# Altium footprint library PcbLib_ICs_part2.PcbLib: 66 footprints (part 2 of 5) (continued)
## DFN-10_ONSEMI [mm] "DFN-10 package with 0.5mm pitch"
height 1
pads (11):
  rect 0.3x0.7 smd paste+0 mask+0.05: 1(-1,-1.5)
  oval 0.3x0.7 smd paste+0 mask+0.05: 2(-0.5,-1.5) 3(0,-1.5) 4(0.5,-1.5) 5(1,-1.5) 6(1,1.5) 7(0.5,1.5) 8(0,1.5) 9(-0.5,1.5) 10(-1,1.5)
  rrect10% 2.64x1.9 smd paste-10 mask+0.05: EP(0,0)
via 0,0 diameter 0.7 hole 0.3
via -0.8,-0.4 diameter 0.7 hole 0.3
via -0.8,0.4 diameter 0.7 hole 0.3
via 0.8,0.4 diameter 0.7 hole 0.3
via 0.8,-0.4 diameter 0.7 hole 0.3
Top Overlay:
  circle w0.25: c-1.55,-2.35 r0.125
  lines w0.2: -1.525,-1.7 -1.7,-1.7 -1.7,1.7 -1.525,1.7 ; 1.525,-1.7 1.7,-1.7 1.7,1.7 1.525,1.7
Top Paste:
  region: 0.5,0.7 0.5,0.1 1.1,0.1 1.1,0.7
  region: 0.5,-0.1 0.5,-0.7 1.1,-0.7 1.1,-0.1
  region: -0.5,-0.7 -0.5,-0.1 -1.1,-0.1 -1.1,-0.7
  region: -0.5,0.1 -0.5,0.7 -1.1,0.7 -1.1,0.1
  region: 0.3,-0.7 0.3,-0.1 -0.3,-0.1 -0.3,-0.7
  region: 0.3,0.1 0.3,0.7 -0.3,0.7 -0.3,0.1
Bottom Solder:
  region: -1.6,-1 -1.6,-0.3 -1.3,0 -1.6,0.3 -1.6,1 -0.3,1 0,0.7 0.3,1 1.6,1 1.6,0.3 1.3,0 1.6,-0.3 1.6,-1 0.3,-1 0,-0.7 -0.3,-1
Top Assy:
  circle w0.05: c-1.25,-1.25 r0.15
  lines w0.05: -1.13,-1.55 -1.13,-1.675 -0.88,-1.675 -0.88,-1.55 ; -1.13,1.55 -1.13,1.675 -0.88,1.675 -0.88,1.55 ; -0.63,-1.55 -0.63,-1.675 -0.38,-1.675 -0.38,-1.55 ; -0.63,1.55 -0.63,1.675 -0.38,1.675 -0.38,1.55 ; -0.13,-1.55 -0.13,-1.675 0.12,-1.675 0.12,-1.55 ; -0.13,1.55 -0.13,1.675 0.12,1.675 0.12,1.55 ; 0.37,-1.55 0.37,-1.675 0.62,-1.675 0.62,-1.55 ; 0.37,1.55 0.37,1.675 0.62,1.675 0.62,1.55 ; 0.87,-1.55 0.87,-1.675 1.12,-1.675 1.12,-1.55 ; 0.87,1.55 0.87,1.675 1.12,1.675 1.12,1.55 ; -1.55,-1.55 -1.55,1.55 1.55,1.55 1.55,-1.55 -1.55,-1.55
  text ".Designator" at -3.443,-0.467 h2
Top Text:
  lines w0.05: -1.85,-1.85 -1.85,1.85 1.85,1.85 1.85,-1.85 -1.85,-1.85
  lines w0.1: -0.5,0 0.5,0 ; 0,-0.5 0,0.5
3D body "DFN10_ONSEMI.x_t": height 1, standoff 0, extent -1.5,-1.525 1.5,1.525

## eLQFP-128 [mm] "TSQFP, 128-Leads, Body 14.00x14.00mm, Pitch 0.40mm, IPC Medium Density"
height 1.6
pads (129):
  rect 0.2x1.3 smd paste+0 mask+0.05: 1(-6.2,-7.725)
  oval 0.2x1.3 smd paste+0 mask+0.05: 2(-5.8,-7.725) 3(-5.4,-7.725) 4(-5,-7.725) 5(-4.6,-7.725) 6(-4.2,-7.725) 7(-3.8,-7.725) 8(-3.4,-7.725) 9(-3,-7.725) 10(-2.6,-7.725) 11(-2.2,-7.725) 12(-1.8,-7.725) 13(-1.4,-7.725) 14(-1,-7.725) 15(-0.6,-7.725) 16(-0.2,-7.725) 17(0.2,-7.725) 18(0.6,-7.725) 19(1,-7.725) 20(1.4,-7.725) 21(1.8,-7.725) 22(2.2,-7.725) 23(2.6,-7.725) 24(3,-7.725) 25(3.4,-7.725) 26(3.8,-7.725) 27(4.2,-7.725) 28(4.6,-7.725) 29(5,-7.725) 30(5.4,-7.725) 31(5.8,-7.725) 32(6.2,-7.725) 65(6.2,7.725) 66(5.8,7.725) 67(5.4,7.725) 68(5,7.725) 69(4.6,7.725) 70(4.2,7.725) 71(3.8,7.725) 72(3.4,7.725) 73(3,7.725) 74(2.6,7.725) 75(2.2,7.725) 76(1.8,7.725) 77(1.4,7.725) 78(1,7.725) 79(0.6,7.725) 80(0.2,7.725) 81(-0.2,7.725) 82(-0.6,7.725) 83(-1,7.725) 84(-1.4,7.725) 85(-1.8,7.725) 86(-2.2,7.725) 87(-2.6,7.725) 88(-3,7.725) 89(-3.4,7.725) 90(-3.8,7.725) 91(-4.2,7.725) 92(-4.6,7.725) 93(-5,7.725) 94(-5.4,7.725) 95(-5.8,7.725) 96(-6.2,7.725)
  oval 1.3x0.2 smd paste+0 mask+0.05: 33(7.725,-6.2) 34(7.725,-5.8) 35(7.725,-5.4) 36(7.725,-5) 37(7.725,-4.6) 38(7.725,-4.2) 39(7.725,-3.8) 40(7.725,-3.4) 41(7.725,-3) 42(7.725,-2.6) 43(7.725,-2.2) 44(7.725,-1.8) 45(7.725,-1.4) 46(7.725,-1) 47(7.725,-0.6) 48(7.725,-0.2) 49(7.725,0.2) 50(7.725,0.6) 51(7.725,1) 52(7.725,1.4) 53(7.725,1.8) 54(7.725,2.2) 55(7.725,2.6) 56(7.725,3) 57(7.725,3.4) 58(7.725,3.8) 59(7.725,4.2) 60(7.725,4.6) 61(7.725,5) 62(7.725,5.4) 63(7.725,5.8) 64(7.725,6.2) 97(-7.725,6.2) 98(-7.725,5.8) 99(-7.725,5.4) 100(-7.725,5) 101(-7.725,4.6) 102(-7.725,4.2) 103(-7.725,3.8) 104(-7.725,3.4) 105(-7.725,3) 106(-7.725,2.6) 107(-7.725,2.2) 108(-7.725,1.8) 109(-7.725,1.4) 110(-7.725,1) 111(-7.725,0.6) 112(-7.725,0.2) 113(-7.725,-0.2) 114(-7.725,-0.6) 115(-7.725,-1) 116(-7.725,-1.4) 117(-7.725,-1.8) 118(-7.725,-2.2) 119(-7.725,-2.6) 120(-7.725,-3) 121(-7.725,-3.4) 122(-7.725,-3.8) 123(-7.725,-4.2) 124(-7.725,-4.6) 125(-7.725,-5) 126(-7.725,-5.4) 127(-7.725,-5.8) 128(-7.725,-6.2)
  rrect5% 8.2x8.2 smd paste-5 mask+0.05: EP(0,0)
Top Overlay:
  circle w0.25: c-6.9,-7.725 r0.125
  circle w0.6: c-5.6,-5.6 r0.3
  lines w0.2: -9.6,-6.2 -8.6,-6.2 ; -9.6,-3 -8.6,-3 ; -9.6,0.2 -8.6,0.2 ; -9.6,3.4 -8.6,3.4 ; -9.6,6.2 -8.6,6.2 ; -7.125,-6.525 -7.125,-7.125 -6.5,-7.125 ; -7.075,6.45 -7.075,7.075 -6.475,7.075 ; -6.2,-9.6 -6.2,-8.6 ; -6.2,8.6 -6.2,9.4 ; -3.4,-9.6 -3.4,-8.6 ; -3,8.6 -3,9.6 ; -0.2,-9.6 -0.2,-8.6 ; 0.2,8.6 0.2,9.6 ; 3,-9.6 3,-8.6 ; 3.4,8.6 3.4,9.6 ; 6.2,-9.6 6.2,-8.6 ; 6.2,8.6 6.2,9.6 ; 6.5,7.125 7.125,7.125 7.125,6.525 ; 6.525,-7.125 7.125,-7.125 7.125,-6.5 ; 8.6,-6.2 9.6,-6.2 ; 8.6,-3.4 9.6,-3.4 ; 8.6,-0.2 9.6,-0.2 ; 8.6,3 9.6,3 ; 8.6,6.2 9.6,6.2
Top Paste:
  region: 2.5,-3.3 2.5,-3.9 3.1,-3.9 3.1,-3.3
  region: 2.5,-2.5 2.5,-3.1 3.1,-3.1 3.1,-2.5
  region: 2.5,-1.7 2.5,-2.3 3.1,-2.3 3.1,-1.7
  region: 2.5,-0.9 2.5,-1.5 3.1,-1.5 3.1,-0.9
  region: 3.3,-3.3 3.3,-3.9 3.9,-3.9 3.9,-3.3
  region: 3.3,-2.5 3.3,-3.1 3.9,-3.1 3.9,-2.5
  region: 3.3,-1.7 3.3,-2.3 3.9,-2.3 3.9,-1.7
  region: 3.3,-0.9 3.3,-1.5 3.9,-1.5 3.9,-0.9
  region: 0.9,-3.3 0.9,-3.9 1.5,-3.9 1.5,-3.3
  region: 0.9,-2.5 0.9,-3.1 1.5,-3.1 1.5,-2.5
  region: 0.9,-1.7 0.9,-2.3 1.5,-2.3 1.5,-1.7
  region: 0.9,-0.9 0.9,-1.5 1.5,-1.5 1.5,-0.9
  region: 1.7,-3.3 1.7,-3.9 2.3,-3.9 2.3,-3.3
  region: 1.7,-2.5 1.7,-3.1 2.3,-3.1 2.3,-2.5
  region: 1.7,-1.7 1.7,-2.3 2.3,-2.3 2.3,-1.7
  region: 1.7,-0.9 1.7,-1.5 2.3,-1.5 2.3,-0.9
  region: -2.3,-3.3 -2.3,-3.9 -1.7,-3.9 -1.7,-3.3
  region: -2.3,-2.5 -2.3,-3.1 -1.7,-3.1 -1.7,-2.5
  region: -2.3,-1.7 -2.3,-2.3 -1.7,-2.3 -1.7,-1.7
  region: -2.3,-0.9 -2.3,-1.5 -1.7,-1.5 -1.7,-0.9
  region: -1.5,-3.3 -1.5,-3.9 -0.9,-3.9 -0.9,-3.3
  region: -1.5,-2.5 -1.5,-3.1 -0.9,-3.1 -0.9,-2.5
  region: -1.5,-1.7 -1.5,-2.3 -0.9,-2.3 -0.9,-1.7
  region: -1.5,-0.9 -1.5,-1.5 -0.9,-1.5 -0.9,-0.9
  region: -3.9,-3.3 -3.9,-3.9 -3.3,-3.9 -3.3,-3.3
  region: -3.9,-2.5 -3.9,-3.1 -3.3,-3.1 -3.3,-2.5
  region: -3.9,-1.7 -3.9,-2.3 -3.3,-2.3 -3.3,-1.7
  region: -3.9,-0.9 -3.9,-1.5 -3.3,-1.5 -3.3,-0.9
  region: -3.1,-3.3 -3.1,-3.9 -2.5,-3.9 -2.5,-3.3
  region: -3.1,-2.5 -3.1,-3.1 -2.5,-3.1 -2.5,-2.5
  region: -3.1,-1.7 -3.1,-2.3 -2.5,-2.3 -2.5,-1.7
  region: -3.1,-0.9 -3.1,-1.5 -2.5,-1.5 -2.5,-0.9
  region: -2.5,3.3 -2.5,3.9 -3.1,3.9 -3.1,3.3
  region: -2.5,2.5 -2.5,3.1 -3.1,3.1 -3.1,2.5
  region: -2.5,1.7 -2.5,2.3 -3.1,2.3 -3.1,1.7
  region: -2.5,0.9 -2.5,1.5 -3.1,1.5 -3.1,0.9
  region: -3.3,3.3 -3.3,3.9 -3.9,3.9 -3.9,3.3
  region: -3.3,2.5 -3.3,3.1 -3.9,3.1 -3.9,2.5
  region: -3.3,1.7 -3.3,2.3 -3.9,2.3 -3.9,1.7
  region: -3.3,0.9 -3.3,1.5 -3.9,1.5 -3.9,0.9
  region: -0.9,3.3 -0.9,3.9 -1.5,3.9 -1.5,3.3
  region: -0.9,2.5 -0.9,3.1 -1.5,3.1 -1.5,2.5
  region: -0.9,1.7 -0.9,2.3 -1.5,2.3 -1.5,1.7
  region: -0.9,0.9 -0.9,1.5 -1.5,1.5 -1.5,0.9
  region: -1.7,3.3 -1.7,3.9 -2.3,3.9 -2.3,3.3
  region: -1.7,2.5 -1.7,3.1 -2.3,3.1 -2.3,2.5
  region: -1.7,1.7 -1.7,2.3 -2.3,2.3 -2.3,1.7
  region: -1.7,0.9 -1.7,1.5 -2.3,1.5 -2.3,0.9
  region: 3.9,3.3 3.9,3.9 3.3,3.9 3.3,3.3
  region: 3.9,2.5 3.9,3.1 3.3,3.1 3.3,2.5
  region: 3.9,1.7 3.9,2.3 3.3,2.3 3.3,1.7
  region: 3.9,0.9 3.9,1.5 3.3,1.5 3.3,0.9
  region: 3.1,3.3 3.1,3.9 2.5,3.9 2.5,3.3
  region: 3.1,2.5 3.1,3.1 2.5,3.1 2.5,2.5
  region: 3.1,1.7 3.1,2.3 2.5,2.3 2.5,1.7
  region: 3.1,0.9 3.1,1.5 2.5,1.5 2.5,0.9
  region: 2.3,3.3 2.3,3.9 1.7,3.9 1.7,3.3
  region: 2.3,2.5 2.3,3.1 1.7,3.1 1.7,2.5
  region: 2.3,1.7 2.3,2.3 1.7,2.3 1.7,1.7
  region: 2.3,0.9 2.3,1.5 1.7,1.5 1.7,0.9
  region: 1.5,3.3 1.5,3.9 0.9,3.9 0.9,3.3
  region: 1.5,2.5 1.5,3.1 0.9,3.1 0.9,2.5
  region: 1.5,1.7 1.5,2.3 0.9,2.3 0.9,1.7
  region: 1.5,0.9 1.5,1.5 0.9,1.5 0.9,0.9
  region: 0.7,3.3 0.7,3.9 0.1,3.9 0.1,3.3
  region: 0.7,2.5 0.7,3.1 0.1,3.1 0.1,2.5
  region: 0.7,1.7 0.7,2.3 0.1,2.3 0.1,1.7
  region: 0.7,0.9 0.7,1.5 0.1,1.5 0.1,0.9
  region: -0.1,3.3 -0.1,3.9 -0.7,3.9 -0.7,3.3
  region: -0.1,2.5 -0.1,3.1 -0.7,3.1 -0.7,2.5
  region: -0.1,1.7 -0.1,2.3 -0.7,2.3 -0.7,1.7
  region: -0.1,0.9 -0.1,1.5 -0.7,1.5 -0.7,0.9
  region: -0.7,-3.3 -0.7,-3.9 -0.1,-3.9 -0.1,-3.3
  region: -0.7,-2.5 -0.7,-3.1 -0.1,-3.1 -0.1,-2.5
  region: -0.7,-1.7 -0.7,-2.3 -0.1,-2.3 -0.1,-1.7
  region: -0.7,-0.9 -0.7,-1.5 -0.1,-1.5 -0.1,-0.9
  region: 0.1,-3.3 0.1,-3.9 0.7,-3.9 0.7,-3.3
  region: 0.1,-2.5 0.1,-3.1 0.7,-3.1 0.7,-2.5
  region: 0.1,-1.7 0.1,-2.3 0.7,-2.3 0.7,-1.7
  region: 0.1,-0.9 0.1,-1.5 0.7,-1.5 0.7,-0.9
  region: -3.3,0.7 -3.9,0.7 -3.9,0.1 -3.3,0.1
  region: -2.5,0.7 -3.1,0.7 -3.1,0.1 -2.5,0.1
  region: -1.7,0.7 -2.3,0.7 -2.3,0.1 -1.7,0.1
  region: -0.9,0.7 -1.5,0.7 -1.5,0.1 -0.9,0.1
  region: -3.3,-0.1 -3.9,-0.1 -3.9,-0.7 -3.3,-0.7
  region: -2.5,-0.1 -3.1,-0.1 -3.1,-0.7 -2.5,-0.7
  region: -1.7,-0.1 -2.3,-0.1 -2.3,-0.7 -1.7,-0.7
  region: -0.9,-0.1 -1.5,-0.1 -1.5,-0.7 -0.9,-0.7
  rectangle: 3.3,0.1 3.9,0.7
  rectangle: 2.5,0.1 3.1,0.7
  rectangle: 1.7,0.1 2.3,0.7
  rectangle: 0.9,0.1 1.5,0.7
  rectangle: 3.3,-0.7 3.9,-0.1
  rectangle: 2.5,-0.7 3.1,-0.1
  rectangle: 1.7,-0.7 2.3,-0.1
  rectangle: 0.9,-0.7 1.5,-0.1
  rectangle: -0.7,-0.7 -0.1,-0.1
  rectangle: 0.1,-0.7 0.7,-0.1
  rectangle: 0.1,0.1 0.7,0.7
  rectangle: -0.7,0.1 -0.1,0.7
Top Assy:
  drawing of 2431 lines, arcs and shapes, not listed
  text ".Designator" at -3.443,-0.467 h2
Top Text:
  lines w0.05: -8.7,-8.7 -8.7,8.7 8.7,8.7 8.7,-8.7 -8.7,-8.7
  lines w0.1: -0.5,0 0.5,0 ; 0,-0.5 0,0.5
3D body "eLQFP-128.STEP": height 1.44, standoff -0.04, extent -8,-8 8,8

## FBGA200_LPDDR4 [mm] "BGA, 200-Leads, Body 10,00x15,00mmx0,90mm, Pitch 0,65mm"
height 0.9
pads (200):
  round 0.27 smd mask+0.05: A1(-4.4,6.825) A2(-3.6,6.825) A3(-2.8,6.825) A4(-2,6.825) A5(-1.2,6.825) A8(1.2,6.825) A9(2,6.825) A10(2.8,6.825) A11(3.6,6.825) A12(4.4,6.825) AA1(-4.4,-6.175) AA2(-3.6,-6.175) AA3(-2.8,-6.175) AA4(-2,-6.175) AA5(-1.2,-6.175) AA8(1.2,-6.175) AA9(2,-6.175) AA10(2.8,-6.175) AA11(3.6,-6.175) AA12(4.4,-6.175) AB1(-4.4,-6.825) AB2(-3.6,-6.825) AB3(-2.8,-6.825) AB4(-2,-6.825) AB5(-1.2,-6.825) AB8(1.2,-6.825) AB9(2,-6.825) AB10(2.8,-6.825) AB11(3.6,-6.825) AB12(4.4,-6.825) B1(-4.4,6.175) B2(-3.6,6.175) B3(-2.8,6.175) B4(-2,6.175) B5(-1.2,6.175) B8(1.2,6.175) B9(2,6.175) B10(2.8,6.175) B11(3.6,6.175) B12(4.4,6.175) C1(-4.4,5.525) C2(-3.6,5.525) C3(-2.8,5.525) C4(-2,5.525) C5(-1.2,5.525) C8(1.2,5.525) C9(2,5.525) C10(2.8,5.525) C11(3.6,5.525) C12(4.4,5.525) D1(-4.4,4.875) D2(-3.6,4.875) D3(-2.8,4.875) D4(-2,4.875) D5(-1.2,4.875) D8(1.2,4.875) D9(2,4.875) D10(2.8,4.875) D11(3.6,4.875) D12(4.4,4.875) E1(-4.4,4.225) E2(-3.6,4.225) E3(-2.8,4.225) E4(-2,4.225) E5(-1.2,4.225) E8(1.2,4.225) E9(2,4.225) E10(2.8,4.225) E11(3.6,4.225) E12(4.4,4.225) F1(-4.4,3.575) F2(-3.6,3.575) F3(-2.8,3.575) F4(-2,3.575) F5(-1.2,3.575) F8(1.2,3.575) F9(2,3.575) F10(2.8,3.575) F11(3.6,3.575) F12(4.4,3.575) G1(-4.4,2.925) G2(-3.6,2.925) G3(-2.8,2.925) G4(-2,2.925) G5(-1.2,2.925) G8(1.2,2.925) G9(2,2.925) G10(2.8,2.925) G11(3.6,2.925) G12(4.4,2.925) H1(-4.4,2.275) H2(-3.6,2.275) H3(-2.8,2.275) H4(-2,2.275) H5(-1.2,2.275) H8(1.2,2.275) H9(2,2.275) H10(2.8,2.275) H11(3.6,2.275) H12(4.4,2.275) J1(-4.4,1.625) J2(-3.6,1.625) J3(-2.8,1.625) J4(-2,1.625) J5(-1.2,1.625) J8(1.2,1.625) J9(2,1.625) J10(2.8,1.625) J11(3.6,1.625) J12(4.4,1.625) K1(-4.4,0.975) K2(-3.6,0.975) K3(-2.8,0.975) K4(-2,0.975) K5(-1.2,0.975) K8(1.2,0.975) K9(2,0.975) K10(2.8,0.975) K11(3.6,0.975) K12(4.4,0.975) N1(-4.4,-0.975) N2(-3.6,-0.975) N3(-2.8,-0.975) N4(-2,-0.975) N5(-1.2,-0.975) N8(1.2,-0.975) N9(2,-0.975) N10(2.8,-0.975) N11(3.6,-0.975) N12(4.4,-0.975) P1(-4.4,-1.625) P2(-3.6,-1.625) P3(-2.8,-1.625) P4(-2,-1.625) P5(-1.2,-1.625) P8(1.2,-1.625) P9(2,-1.625) P10(2.8,-1.625) P11(3.6,-1.625) P12(4.4,-1.625) R1(-4.4,-2.275) R2(-3.6,-2.275) R3(-2.8,-2.275) R4(-2,-2.275) R5(-1.2,-2.275) R8(1.2,-2.275) R9(2,-2.275) R10(2.8,-2.275) R11(3.6,-2.275) R12(4.4,-2.275) T1(-4.4,-2.925) T2(-3.6,-2.925) T3(-2.8,-2.925) T4(-2,-2.925) T5(-1.2,-2.925) T8(1.2,-2.925) T9(2,-2.925) T10(2.8,-2.925) T11(3.6,-2.925) T12(4.4,-2.925) U1(-4.4,-3.575) U2(-3.6,-3.575) U3(-2.8,-3.575) U4(-2,-3.575) U5(-1.2,-3.575) U8(1.2,-3.575) U9(2,-3.575) U10(2.8,-3.575) U11(3.6,-3.575) U12(4.4,-3.575) V1(-4.4,-4.225) V2(-3.6,-4.225) V3(-2.8,-4.225) V4(-2,-4.225) V5(-1.2,-4.225) V8(1.2,-4.225) V9(2,-4.225) V10(2.8,-4.225) V11(3.6,-4.225) V12(4.4,-4.225) W1(-4.4,-4.875) W2(-3.6,-4.875) W3(-2.8,-4.875) W4(-2,-4.875) W5(-1.2,-4.875) W8(1.2,-4.875) W9(2,-4.875) W10(2.8,-4.875) W11(3.6,-4.875) W12(4.4,-4.875) Y1(-4.4,-5.525) Y2(-3.6,-5.525) Y3(-2.8,-5.525) Y4(-2,-5.525) Y5(-1.2,-5.525) Y8(1.2,-5.525) Y9(2,-5.525) Y10(2.8,-5.525) Y11(3.6,-5.525) Y12(4.4,-5.525)
Top Overlay:
  circle w0.25: c-5.6,6.8 r0.125
  rectangle: -5,7.1 -4.6,7.5
  lines w0.2: -5,-7.5 5,-7.5 5,7.5 -5,7.5 -5,-7.5
Top Assy:
  circle w0.05: c-4,6.5 r0.5
  lines w0.05: -5,-7.5 5,-7.5 5,7.5 -5,7.5 -5,-7.5
  text ".Designator" at -5.162,-0.7 h3
Top Text:
  lines w0.05: -5.25,-7.75 5.25,-7.75 5.25,7.75 -5.25,7.75 -5.25,-7.75
  lines w0.1: -0.5,0 0.5,0 ; 0,-0.5 0,0.5
3D body "LPDDR4_200ball.x_t": height 0.88, standoff -0.02, extent -5,-7.5 5,7.5

## FCBGA828_RK3399 [mm]
height 1.75
pads (828):
  round 0.33 smd mask+0.05: A1(-9.75,9.75) A2(-9.1,9.75) A3(-8.45,9.75) A4(-7.8,9.75) A5(-7.15,9.75) A6(-6.5,9.75) A7(-5.85,9.75) A8(-5.2,9.75) A9(-4.55,9.75) A10(-3.9,9.75) A11(-3.25,9.75) A12(-2.6,9.75) A13(-1.95,9.75) A14(-1.3,9.75) A15(-0.65,9.75) A16(0,9.75) A17(0.65,9.75) A18(1.3,9.75) A19(1.95,9.75) A20(2.6,9.75) A21(3.25,9.75) A22(3.9,9.75) A23(4.55,9.75) A24(5.2,9.75) A25(5.85,9.75) A26(6.5,9.75) A27(7.15,9.75) A28(7.8,9.75) A29(8.45,9.75) A30(9.1,9.75) A31(9.75,9.75) AA1(-9.75,-3.25) AA2(-9.1,-3.25) AA3(-8.45,-3.25) AA4(-7.8,-3.25) AA5(-7.15,-3.25) AA6(-6.5,-3.25) AA7(-5.85,-3.25) AA8(-5.2,-3.25) AA9(-4.55,-3.25) AA10(-3.9,-3.25) AA11(-3.25,-3.25) AA12(-2.6,-3.25) AA13(-1.95,-3.25) AA14(-1.3,-3.25) AA15(-0.65,-3.25) AA16(0,-3.25) AA17(0.65,-3.25) AA18(1.3,-3.25) AA19(1.95,-3.25) AA20(2.6,-3.25) AA21(3.25,-3.25) AA22(3.9,-3.25) AA23(4.55,-3.25) AA24(5.2,-3.25) AA25(5.85,-3.25) AA26(6.5,-3.25) AA27(7.15,-3.25) AA28(7.8,-3.25) AA29(8.45,-3.25) AA30(9.1,-3.25) AA31(9.75,-3.25) AB1(-9.75,-3.9) AB2(-9.1,-3.9) AB8(-5.2,-3.9) AB9(-4.55,-3.9) AB10(-3.9,-3.9) AB11(-3.25,-3.9) AB12(-2.6,-3.9) AB13(-1.95,-3.9) AB14(-1.3,-3.9) AB15(-0.65,-3.9) AB16(0,-3.9) AB17(0.65,-3.9) AB18(1.3,-3.9) AB19(1.95,-3.9) AB20(2.6,-3.9) AB21(3.25,-3.9) AB22(3.9,-3.9) AB23(4.55,-3.9) AB24(5.2,-3.9) AB30(9.1,-3.9) AB31(9.75,-3.9) AC1(-9.75,-4.55) AC2(-9.1,-4.55) AC3(-8.45,-4.55) AC4(-7.8,-4.55) AC5(-7.15,-4.55) AC6(-6.5,-4.55) AC7(-5.85,-4.55) AC8(-5.2,-4.55) AC9(-4.55,-4.55) AC10(-3.9,-4.55) AC11(-3.25,-4.55) AC12(-2.6,-4.55) AC13(-1.95,-4.55) AC14(-1.3,-4.55) AC15(-0.65,-4.55) AC16(0,-4.55) AC17(0.65,-4.55) AC18(1.3,-4.55) AC19(1.95,-4.55) AC20(2.6,-4.55) AC21(3.25,-4.55) AC22(3.9,-4.55) AC23(4.55,-4.55) AC24(5.2,-4.55) AC25(5.85,-4.55) AC26(6.5,-4.55) AC27(7.15,-4.55) AC28(7.8,-4.55) AC29(8.45,-4.55) AC30(9.1,-4.55) AC31(9.75,-4.55) AD1(-9.75,-5.2) AD2(-9.1,-5.2) AD3(-8.45,-5.2) AD4(-7.8,-5.2) AD5(-7.15,-5.2) AD6(-6.5,-5.2) AD7(-5.85,-5.2) AD8(-5.2,-5.2) AD9(-4.55,-5.2) AD10(-3.9,-5.2) AD11(-3.25,-5.2) AD12(-2.6,-5.2) AD13(-1.95,-5.2) AD14(-1.3,-5.2) AD15(-0.65,-5.2) AD16(0,-5.2) AD17(0.65,-5.2) AD18(1.3,-5.2) AD19(1.95,-5.2) AD20(2.6,-5.2) AD21(3.25,-5.2) AD22(3.9,-5.2) AD23(4.55,-5.2) AD24(5.2,-5.2) AD25(5.85,-5.2) AD26(6.5,-5.2) AD27(7.15,-5.2) AD28(7.8,-5.2) AD29(8.45,-5.2) AD30(9.1,-5.2) AD31(9.75,-5.2) AE1(-9.75,-5.85) AE2(-9.1,-5.85) AE5(-7.15,-5.85) AE6(-6.5,-5.85) AE8(-5.2,-5.85) AE9(-4.55,-5.85) AE11(-3.25,-5.85) AE12(-2.6,-5.85) AE14(-1.3,-5.85) AE15(-0.65,-5.85) AE17(0.65,-5.85) AE18(1.3,-5.85) AE20(2.6,-5.85) AE21(3.25,-5.85) AE23(4.55,-5.85) AE24(5.2,-5.85) AE26(6.5,-5.85) AE27(7.15,-5.85) AE30(9.1,-5.85) AE31(9.75,-5.85) AF1(-9.75,-6.5) AF2(-9.1,-6.5) AF3(-8.45,-6.5) AF4(-7.8,-6.5) AF5(-7.15,-6.5) AF7(-5.85,-6.5) AF8(-5.2,-6.5) AF9(-4.55,-6.5) AF11(-3.25,-6.5) AF12(-2.6,-6.5) AF14(-1.3,-6.5) AF15(-0.65,-6.5) AF17(0.65,-6.5) AF18(1.3,-6.5) AF20(2.6,-6.5) AF21(3.25,-6.5) AF23(4.55,-6.5) AF24(5.2,-6.5) AF25(5.85,-6.5) AF27(7.15,-6.5) AF28(7.8,-6.5) AF29(8.45,-6.5) AF30(9.1,-6.5) AF31(9.75,-6.5) AG1(-9.75,-7.15) AG2(-9.1,-7.15) AG3(-8.45,-7.15) AG4(-7.8,-7.15) AG6(-6.5,-7.15) AG7(-5.85,-7.15) AG8(-5.2,-7.15) AG9(-4.55,-7.15) AG11(-3.25,-7.15) AG12(-2.6,-7.15) AG14(-1.3,-7.15) AG15(-0.65,-7.15) AG17(0.65,-7.15) AG18(1.3,-7.15) AG20(2.6,-7.15) AG21(3.25,-7.15) AG23(4.55,-7.15) AG24(5.2,-7.15) AG25(5.85,-7.15) AG26(6.5,-7.15) AG28(7.8,-7.15) AG29(8.45,-7.15) AG30(9.1,-7.15) AG31(9.75,-7.15) AH1(-9.75,-7.8) AH2(-9.1,-7.8) AH3(-8.45,-7.8) AH5(-7.15,-7.8) AH6(-6.5,-7.8) AH8(-5.2,-7.8) AH9(-4.55,-7.8) AH11(-3.25,-7.8) AH12(-2.6,-7.8) AH14(-1.3,-7.8) AH15(-0.65,-7.8) AH17(0.65,-7.8) AH18(1.3,-7.8) AH20(2.6,-7.8) AH21(3.25,-7.8) AH23(4.55,-7.8) AH24(5.2,-7.8) AH26(6.5,-7.8) AH27(7.15,-7.8) AH29(8.45,-7.8) AH30(9.1,-7.8) AH31(9.75,-7.8) AJ1(-9.75,-8.45) AJ2(-9.1,-8.45) AJ3(-8.45,-8.45) AJ4(-7.8,-8.45) AJ5(-7.15,-8.45) AJ6(-6.5,-8.45) AJ8(-5.2,-8.45) AJ9(-4.55,-8.45) AJ11(-3.25,-8.45) AJ12(-2.6,-8.45) AJ14(-1.3,-8.45) AJ15(-0.65,-8.45) AJ17(0.65,-8.45) AJ18(1.3,-8.45) AJ20(2.6,-8.45) AJ21(3.25,-8.45) AJ23(4.55,-8.45) AJ24(5.2,-8.45) AJ26(6.5,-8.45) AJ27(7.15,-8.45) AJ28(7.8,-8.45) AJ29(8.45,-8.45) AJ30(9.1,-8.45) AJ31(9.75,-8.45) AK1(-9.75,-9.1) AK2(-9.1,-9.1) AK3(-8.45,-9.1) AK4(-7.8,-9.1) AK5(-7.15,-9.1) AK6(-6.5,-9.1) AK7(-5.85,-9.1) AK8(-5.2,-9.1) AK9(-4.55,-9.1) AK10(-3.9,-9.1) AK11(-3.25,-9.1) AK12(-2.6,-9.1) AK13(-1.95,-9.1) AK14(-1.3,-9.1) AK15(-0.65,-9.1) AK16(0,-9.1) AK17(0.65,-9.1) AK18(1.3,-9.1) AK19(1.95,-9.1) AK20(2.6,-9.1) AK21(3.25,-9.1) AK22(3.9,-9.1) AK23(4.55,-9.1) AK24(5.2,-9.1) AK25(5.85,-9.1) AK26(6.5,-9.1) AK27(7.15,-9.1) AK28(7.8,-9.1) AK29(8.45,-9.1) AK30(9.1,-9.1) AK31(9.75,-9.1) AL1(-9.75,-9.75) AL2(-9.1,-9.75) AL3(-8.45,-9.75) AL4(-7.8,-9.75) AL5(-7.15,-9.75) AL6(-6.5,-9.75) AL7(-5.85,-9.75) AL8(-5.2,-9.75) AL9(-4.55,-9.75) AL10(-3.9,-9.75) AL11(-3.25,-9.75) AL12(-2.6,-9.75) AL13(-1.95,-9.75) AL14(-1.3,-9.75) AL15(-0.65,-9.75) AL16(0,-9.75) AL17(0.65,-9.75) AL18(1.3,-9.75) AL19(1.95,-9.75) AL20(2.6,-9.75) AL21(3.25,-9.75) AL22(3.9,-9.75) AL23(4.55,-9.75) AL24(5.2,-9.75) AL25(5.85,-9.75) AL26(6.5,-9.75) AL27(7.15,-9.75) AL28(7.8,-9.75) AL29(8.45,-9.75) AL30(9.1,-9.75) AL31(9.75,-9.75) B1(-9.75,9.1) B2(-9.1,9.1) B3(-8.45,9.1) B4(-7.8,9.1) B5(-7.15,9.1) B6(-6.5,9.1) B7(-5.85,9.1) B8(-5.2,9.1) B9(-4.55,9.1) B10(-3.9,9.1) B11(-3.25,9.1) B12(-2.6,9.1) B13(-1.95,9.1) B14(-1.3,9.1) B15(-0.65,9.1) B16(0,9.1) B17(0.65,9.1) B18(1.3,9.1) B19(1.95,9.1) B20(2.6,9.1) B21(3.25,9.1) B22(3.9,9.1) B23(4.55,9.1) B24(5.2,9.1) B25(5.85,9.1) B26(6.5,9.1) B27(7.15,9.1) B28(7.8,9.1) B29(8.45,9.1) B30(9.1,9.1) B31(9.75,9.1) C1(-9.75,8.45) C2(-9.1,8.45) C3(-8.45,8.45) C4(-7.8,8.45) C5(-7.15,8.45) C6(-6.5,8.45) C8(-5.2,8.45) C9(-4.55,8.45) C11(-3.25,8.45) C12(-2.6,8.45) C14(-1.3,8.45) C15(-0.65,8.45) C17(0.65,8.45) C18(1.3,8.45) C20(2.6,8.45) C21(3.25,8.45) C23(4.55,8.45) C24(5.2,8.45) C26(6.5,8.45) C27(7.15,8.45) C28(7.8,8.45) C29(8.45,8.45) C30(9.1,8.45) C31(9.75,8.45) D1(-9.75,7.8) D2(-9.1,7.8) D3(-8.45,7.8) D5(-7.15,7.8) D6(-6.5,7.8) D8(-5.2,7.8) D9(-4.55,7.8) D11(-3.25,7.8) D12(-2.6,7.8) D14(-1.3,7.8) D15(-0.65,7.8) D17(0.65,7.8) D18(1.3,7.8) D20(2.6,7.8) D21(3.25,7.8) D23(4.55,7.8) D24(5.2,7.8) D26(6.5,7.8) D27(7.15,7.8) D29(8.45,7.8) D30(9.1,7.8) D31(9.75,7.8) E1(-9.75,7.15) E2(-9.1,7.15) E3(-8.45,7.15) E4(-7.8,7.15) E6(-6.5,7.15) E7(-5.85,7.15) E8(-5.2,7.15) E9(-4.55,7.15) E11(-3.25,7.15) E12(-2.6,7.15) E14(-1.3,7.15) E15(-0.65,7.15) E17(0.65,7.15) E18(1.3,7.15) E20(2.6,7.15) E21(3.25,7.15) E23(4.55,7.15) E24(5.2,7.15) E25(5.85,7.15) E26(6.5,7.15) E28(7.8,7.15) E29(8.45,7.15) E30(9.1,7.15) E31(9.75,7.15) F1(-9.75,6.5) F2(-9.1,6.5) F3(-8.45,6.5) F4(-7.8,6.5) F5(-7.15,6.5) F7(-5.85,6.5) F8(-5.2,6.5) F9(-4.55,6.5) F11(-3.25,6.5) F12(-2.6,6.5) F14(-1.3,6.5) F15(-0.65,6.5) F17(0.65,6.5) F18(1.3,6.5) F20(2.6,6.5) F21(3.25,6.5) F23(4.55,6.5) F24(5.2,6.5) F25(5.85,6.5) F27(7.15,6.5) F28(7.8,6.5) F29(8.45,6.5) F30(9.1,6.5) F31(9.75,6.5) G1(-9.75,5.85) G2(-9.1,5.85) G5(-7.15,5.85) G6(-6.5,5.85) G8(-5.2,5.85) G9(-4.55,5.85) G11(-3.25,5.85) G12(-2.6,5.85) G14(-1.3,5.85) G15(-0.65,5.85) G17(0.65,5.85) G18(1.3,5.85) G20(2.6,5.85) G21(3.25,5.85) G23(4.55,5.85) G24(5.2,5.85) G26(6.5,5.85) G27(7.15,5.85) G30(9.1,5.85) G31(9.75,5.85) H1(-9.75,5.2) H2(-9.1,5.2) H3(-8.45,5.2) H4(-7.8,5.2) H5(-7.15,5.2) H6(-6.5,5.2) H7(-5.85,5.2) H9(-4.55,5.2) H10(-3.9,5.2) H11(-3.25,5.2) H12(-2.6,5.2) H13(-1.95,5.2) H14(-1.3,5.2) H15(-0.65,5.2) H16(0,5.2) H17(0.65,5.2) H18(1.3,5.2) H19(1.95,5.2) H20(2.6,5.2) H21(3.25,5.2) H22(3.9,5.2) H23(4.55,5.2) H24(5.2,5.2) H25(5.85,5.2) H26(6.5,5.2) H27(7.15,5.2) H28(7.8,5.2) H29(8.45,5.2) H30(9.1,5.2) H31(9.75,5.2) J1(-9.75,4.55) J2(-9.1,4.55) J3(-8.45,4.55) J4(-7.8,4.55) J5(-7.15,4.55) J6(-6.5,4.55) J7(-5.85,4.55) J8(-5.2,4.55) J9(-4.55,4.55) J10(-3.9,4.55) J11(-3.25,4.55) J12(-2.6,4.55) J13(-1.95,4.55) J14(-1.3,4.55) J15(-0.65,4.55) J16(0,4.55) J17(0.65,4.55) J18(1.3,4.55) J19(1.95,4.55) J20(2.6,4.55) J21(3.25,4.55) J22(3.9,4.55) J23(4.55,4.55) J24(5.2,4.55) J25(5.85,4.55) J26(6.5,4.55) J27(7.15,4.55) J28(7.8,4.55) J29(8.45,4.55) J30(9.1,4.55) J31(9.75,4.55) K1(-9.75,3.9) K2(-9.1,3.9) K8(-5.2,3.9) K9(-4.55,3.9) K10(-3.9,3.9) K11(-3.25,3.9) K12(-2.6,3.9) K13(-1.95,3.9) K14(-1.3,3.9) K15(-0.65,3.9) K16(0,3.9) K17(0.65,3.9) K18(1.3,3.9) K19(1.95,3.9) K20(2.6,3.9) K21(3.25,3.9) K22(3.9,3.9) K23(4.55,3.9) K24(5.2,3.9) K30(9.1,3.9) K31(9.75,3.9) L1(-9.75,3.25) L2(-9.1,3.25) L3(-8.45,3.25) L4(-7.8,3.25) L5(-7.15,3.25) L6(-6.5,3.25) L7(-5.85,3.25) L8(-5.2,3.25) L9(-4.55,3.25) L10(-3.9,3.25) L11(-3.25,3.25) L12(-2.6,3.25) L13(-1.95,3.25) L14(-1.3,3.25) L15(-0.65,3.25) L16(0,3.25) L17(0.65,3.25) L18(1.3,3.25) L19(1.95,3.25) L20(2.6,3.25) L21(3.25,3.25) L22(3.9,3.25) L23(4.55,3.25) L24(5.2,3.25) L25(5.85,3.25) L26(6.5,3.25) L27(7.15,3.25) L28(7.8,3.25) L29(8.45,3.25) L30(9.1,3.25) L31(9.75,3.25) M1(-9.75,2.6) M2(-9.1,2.6) M3(-8.45,2.6) M4(-7.8,2.6) M5(-7.15,2.6) M6(-6.5,2.6) M7(-5.85,2.6) M8(-5.2,2.6) M9(-4.55,2.6) M10(-3.9,2.6) M11(-3.25,2.6) M12(-2.6,2.6) M13(-1.95,2.6) M14(-1.3,2.6) M15(-0.65,2.6) M16(0,2.6) M17(0.65,2.6) M18(1.3,2.6) M19(1.95,2.6) M20(2.6,2.6) M21(3.25,2.6) M22(3.9,2.6) M23(4.55,2.6) M24(5.2,2.6) M25(5.85,2.6) M26(6.5,2.6) M27(7.15,2.6) M28(7.8,2.6) M29(8.45,2.6) M30(9.1,2.6) M31(9.75,2.6) N1(-9.75,1.95) N2(-9.1,1.95) N8(-5.2,1.95) N9(-4.55,1.95) N10(-3.9,1.95) N11(-3.25,1.95) N12(-2.6,1.95) N13(-1.95,1.95) N14(-1.3,1.95) N15(-0.65,1.95) N16(0,1.95) N17(0.65,1.95) N18(1.3,1.95) N19(1.95,1.95) N20(2.6,1.95) N21(3.25,1.95) N22(3.9,1.95) N23(4.55,1.95) N24(5.2,1.95) N30(9.1,1.95) N31(9.75,1.95) P1(-9.75,1.3) P2(-9.1,1.3) P3(-8.45,1.3) P4(-7.8,1.3) P5(-7.15,1.3) P6(-6.5,1.3) P7(-5.85,1.3) P8(-5.2,1.3) P9(-4.55,1.3) P10(-3.9,1.3) P11(-3.25,1.3) P12(-2.6,1.3) P13(-1.95,1.3) P14(-1.3,1.3) P15(-0.65,1.3) P16(0,1.3) P17(0.65,1.3) P18(1.3,1.3) P19(1.95,1.3) P20(2.6,1.3) P21(3.25,1.3) P22(3.9,1.3) P23(4.55,1.3) P24(5.2,1.3) P25(5.85,1.3) P26(6.5,1.3) P27(7.15,1.3) P28(7.8,1.3) P29(8.45,1.3) P30(9.1,1.3) P31(9.75,1.3) R1(-9.75,0.65) R2(-9.1,0.65) R3(-8.45,0.65) R4(-7.8,0.65) R5(-7.15,0.65) R6(-6.5,0.65) R7(-5.85,0.65) R8(-5.2,0.65) R9(-4.55,0.65) R10(-3.9,0.65) R11(-3.25,0.65) R12(-2.6,0.65) R13(-1.95,0.65) R14(-1.3,0.65) R15(-0.65,0.65) R16(0,0.65) R17(0.65,0.65) R18(1.3,0.65) R19(1.95,0.65) R20(2.6,0.65) R21(3.25,0.65) R22(3.9,0.65) R23(4.55,0.65) R24(5.2,0.65) R25(5.85,0.65) R26(6.5,0.65) R27(7.15,0.65) R28(7.8,0.65) R29(8.45,0.65) R30(9.1,0.65) R31(9.75,0.65) T1(-9.75,0) T2(-9.1,0) T8(-5.2,0) T9(-4.55,0) T10(-3.9,0) T11(-3.25,0) T12(-2.6,0) T13(-1.95,0) T14(-1.3,0) T15(-0.65,0) T16(0,0) T17(0.65,0) T18(1.3,0) T19(1.95,0) T20(2.6,0) T21(3.25,0) T22(3.9,0) T23(4.55,0) T24(5.2,0) T30(9.1,0) T31(9.75,0) U1(-9.75,-0.65) U2(-9.1,-0.65) U3(-8.45,-0.65) U4(-7.8,-0.65) U5(-7.15,-0.65) U6(-6.5,-0.65) U7(-5.85,-0.65) U8(-5.2,-0.65) U9(-4.55,-0.65) U10(-3.9,-0.65) U11(-3.25,-0.65) U12(-2.6,-0.65) U13(-1.95,-0.65) U14(-1.3,-0.65) U15(-0.65,-0.65) U16(0,-0.65) U17(0.65,-0.65) U18(1.3,-0.65) U19(1.95,-0.65) U20(2.6,-0.65) U21(3.25,-0.65) U22(3.9,-0.65) U23(4.55,-0.65) U24(5.2,-0.65) U25(5.85,-0.65) U26(6.5,-0.65) U27(7.15,-0.65) U28(7.8,-0.65) U29(8.45,-0.65) U30(9.1,-0.65) U31(9.75,-0.65) V1(-9.75,-1.3) V2(-9.1,-1.3) V3(-8.45,-1.3) V4(-7.8,-1.3) V5(-7.15,-1.3) V6(-6.5,-1.3) V7(-5.85,-1.3) V8(-5.2,-1.3) V9(-4.55,-1.3) V10(-3.9,-1.3) V11(-3.25,-1.3) V12(-2.6,-1.3) V13(-1.95,-1.3) V14(-1.3,-1.3) V15(-0.65,-1.3) V16(0,-1.3) V17(0.65,-1.3) V18(1.3,-1.3) V19(1.95,-1.3) V20(2.6,-1.3) V21(3.25,-1.3) V22(3.9,-1.3) V23(4.55,-1.3) V24(5.2,-1.3) V25(5.85,-1.3) V26(6.5,-1.3) V27(7.15,-1.3) V28(7.8,-1.3) V29(8.45,-1.3) V30(9.1,-1.3) V31(9.75,-1.3) W1(-9.75,-1.95) W2(-9.1,-1.95) W8(-5.2,-1.95) W9(-4.55,-1.95) W10(-3.9,-1.95) W11(-3.25,-1.95) W12(-2.6,-1.95) W13(-1.95,-1.95) W14(-1.3,-1.95) W15(-0.65,-1.95) W16(0,-1.95) W17(0.65,-1.95) W18(1.3,-1.95) W19(1.95,-1.95) W20(2.6,-1.95) W21(3.25,-1.95) W22(3.9,-1.95) W23(4.55,-1.95) W24(5.2,-1.95) W30(9.1,-1.95) W31(9.75,-1.95) Y1(-9.75,-2.6) Y2(-9.1,-2.6) Y3(-8.45,-2.6) Y4(-7.8,-2.6) Y5(-7.15,-2.6) Y6(-6.5,-2.6) Y7(-5.85,-2.6) Y8(-5.2,-2.6) Y9(-4.55,-2.6) Y10(-3.9,-2.6) Y11(-3.25,-2.6) Y12(-2.6,-2.6) Y13(-1.95,-2.6) Y14(-1.3,-2.6) Y15(-0.65,-2.6) Y16(0,-2.6) Y17(0.65,-2.6) Y18(1.3,-2.6) Y19(1.95,-2.6) Y20(2.6,-2.6) Y21(3.25,-2.6) Y22(3.9,-2.6) Y23(4.55,-2.6) Y24(5.2,-2.6) Y25(5.85,-2.6) Y26(6.5,-2.6) Y27(7.15,-2.6) Y28(7.8,-2.6) Y29(8.45,-2.6) Y30(9.1,-2.6) Y31(9.75,-2.6)
Top Overlay:
  circle w0.35: c-11.25,9.75 r0.15
  lines w0.127: -10.5,-10.5 10.5,-10.5 10.5,10.5 -10.5,10.5 -10.5,-10.5
Top Assy:
  drawing of 675 lines, arcs and shapes, not listed
  text ".Designator" at -5.162,-4.95 h3
  text "FCBGA828" at -1.782,-9.506 h0.8
Top Text:
  lines w0.05: -10.75,-10.75 10.75,-10.75 10.75,10.75 -10.75,10.75 -10.75,-10.75
3D body "RK3399.x_t": height 1.56, standoff -0.01, extent -10.5,-10.5 10.5,10.5